# Altium footprint library Angler.PcbLib: 331 footprints (part 2 of 21)
Each footprint in its own frame and in the unit in brackets; x right, y up, seen from the top. Pads: shape width x height; smd on the part's side, far side on the other; paste and mask are expansions set on the pad; w line width, h text height; cw(c..) or ccw(c..) is an arc to the next point about the centre after c.
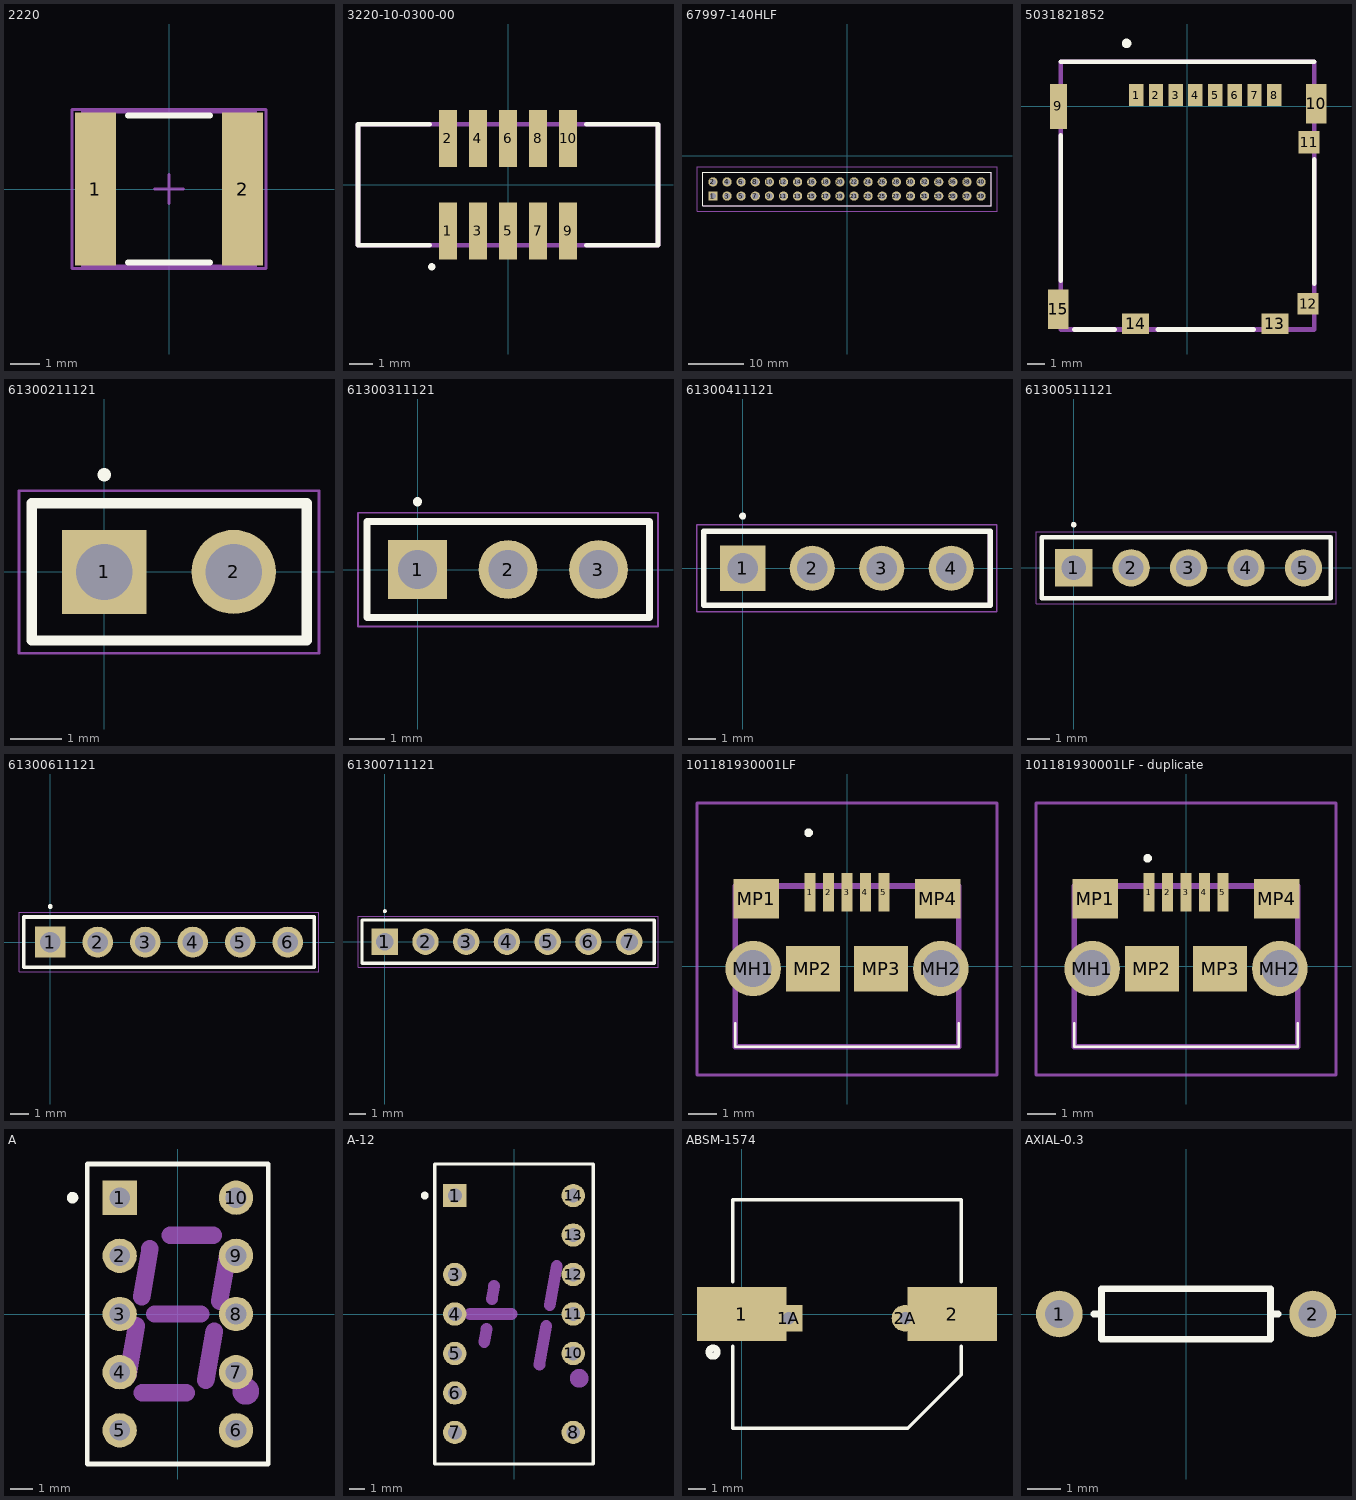
[diagram p1: the footprints below, top view; thin cyan lines are the x and y axes]

## 2220 [mm] "Chip Capacitor, Body 5.7x5.0mm, IPC High Density"
height 1.4
pads (2):
  rect 1.4x5.2 smd: 1(-2.5,0) 2(2.5,0)
Top Overlay:
  lines w0.2: -1.4,-2.5 1.4,-2.5 ; -1.4,2.5 1.4,2.5
Mechanical 13:
  lines w0.1: -2.95,-2.625 -2.95,2.625 2.95,2.625 2.95,-2.625 -2.95,-2.625
Mechanical 15:
  lines w0.1: -0.5,0 0.5,0 ; 0,-0.5 0,0.5 ; -3.3,-2.7 -3.3,2.7 3.3,2.7 3.3,-2.7 -3.3,-2.7
3D body: height 1.4, standoff 0, extent -2.95,-2.625 2.95,2.625

## 3220-10-0300-00 [mm]
pads (10):
  rect 0.76x2.4 smd: 1(-2.54,-1.95) 2(-2.54,1.95) 3(-1.27,-1.95) 4(-1.27,1.95) 5(0,-1.95) 6(0,1.95) 7(1.27,-1.95) 8(1.27,1.95) 9(2.54,-1.95) 10(2.54,1.95)
Top Overlay:
  circle w0.2: c-3.215,-3.463 r0.052
  lines w0.2: -3.3,-2.55 -6.325,-2.55 -6.325,2.55 -3.3,2.55 ; 3.3,-2.55 6.325,-2.55 6.325,2.55 3.3,2.55
Mechanical 13:
  lines w0.2: -6.325,-2.55 6.325,-2.55 6.325,2.55 -6.325,2.55 -6.325,-2.55
3D body "3220-10-0300.STEP": height 5.4, standoff -0.2, extent -6.325,-2.75 6.325,2.75

## 67997-140HLF [mm] "CONN HEADER VERT 40POS"
pads (40):
  rect 1.65x1.65 hole 1.1: 1(-24.13,-7.27)
  round 1.65 hole 1.1: 2(-24.13,-4.73) 3(-21.59,-7.27) 4(-21.59,-4.73) 5(-19.05,-7.27) 6(-19.05,-4.73) 7(-16.51,-7.27) 8(-16.51,-4.73) 9(-13.97,-7.27) 10(-13.97,-4.73) 11(-11.43,-7.27) 12(-11.43,-4.73) 13(-8.89,-7.27) 14(-8.89,-4.73) 15(-6.35,-7.27) 16(-6.35,-4.73) 17(-3.81,-7.27) 18(-3.81,-4.73) 19(-1.27,-7.27) 20(-1.27,-4.73) 21(1.27,-7.27) 22(1.27,-4.73) 23(3.81,-7.27) 24(3.81,-4.73) 25(6.35,-7.27) 26(6.35,-4.73) 27(8.89,-7.27) 28(8.89,-4.73) 29(11.43,-7.27) 30(11.43,-4.73) 31(13.97,-7.27) 32(13.97,-4.73) 33(16.51,-7.27) 34(16.51,-4.73) 35(19.05,-7.27) 36(19.05,-4.73) 37(21.59,-7.27) 38(21.59,-4.73) 39(24.13,-7.27) 40(24.13,-4.73)
Top Overlay:
  lines w0.2: -26,-9 26,-9 26,-3 -26,-3 -26,-9
Mechanical 13:
  lines w0.1: -26,-9 26,-9 26,-3 -26,-3 -26,-9
Mechanical 15:
  lines w0.05: -27,-10 27,-10 27,-2 -27,-2 -27,-10
3D body "61304021121_Download_STP_61304021121_rev1.stp": height 8.77, standoff -2.77, extent -25.4,-8.54 25.4,-3.46

## 5031821852 [mm]
pads (15):
  rect 0.8x1.24 smd: 1(-2.85,0.63) 2(-1.75,0.63) 3(-0.65,0.63) 4(0.45,0.63) 5(1.55,0.63) 6(2.65,0.63) 7(3.75,0.63) 8(4.85,0.63)
  rect 0.95x2.5 smd: 9(-7.195,0)
  rect 1.15x2.2 smd: 10(7.195,0.15) 15(-7.195,-11.33)
  rect 1.16x1.25 smd: 11(6.795,-2)
  rect 1.16x1.2 smd: 12(6.74,-11)
  rect 1.5x1.15 smd: 13(4.89,-12.125) 14(-2.89,-12.125)
Top Overlay:
  circle w0.254: c-3.388,3.517 r0.14
  lines w0.254: -7.07,-9.733 -7.07,-1.618 ; -7.07,2.5 7.07,2.5 ; -6.3,-12.45 -4.055,-12.45 ; -1.654,-12.45 3.704,-12.45 ; 7.07,-9.889 7.07,-2.952
Mechanical 13:
  lines w0.254: -7.07,-12.45 -7.07,2.5 7.07,2.5 7.07,-12.45 -7.07,-12.45
3D body "5031821852_colour.STEP": height 1.5, standoff 0, extent -7.47,-12.58 7.47,2.37

## 61300211121 [mm]
pads (2):
  rect 1.65x1.65 hole 1.1: 1(0,0)
  round 1.65 hole 1.1: 2(2.54,0)
Top Overlay:
  circle w0.254: c0,1.905 r0.002
  lines w0.2: -1.42,-1.345 3.97,-1.345 3.97,1.345 -1.42,1.345 -1.42,-1.345
Mechanical 13:
  lines w0.1: -1.42,-1.345 -1.42,1.345 3.97,1.345 3.97,-1.345 -1.42,-1.345
Mechanical 15:
  lines w0.05: -1.67,-1.595 -1.67,1.595 4.21,1.595 4.21,-1.595 -1.67,-1.595
3D body "Download_STP_61300211121 (rev1).stp": height 8.57, standoff -2.97, extent -1.27,-1.27 3.81,1.27

## 61300311121 [mm]
pads (3):
  rect 1.65x1.65 hole 1.1: 1(0,0)
  round 1.65 hole 1.1: 2(2.54,0) 3(5.08,0)
Top Overlay:
  circle w0.254: c0,1.905 r0.002
  lines w0.2: -1.42,-1.345 -1.42,1.345 6.51,1.345 6.51,-1.345 -1.42,-1.345
Mechanical 13:
  lines w0.1: -1.42,-1.345 6.51,-1.345 6.51,1.345 -1.42,1.345 -1.42,-1.345
Mechanical 15:
  lines w0.05: -1.67,-1.595 6.75,-1.595 6.75,1.595 -1.67,1.595 -1.67,-1.595
3D body "Download_STP_61300311121 (rev1).stp": height 8.57, standoff -2.97, extent -1.27,-1.27 6.35,1.27

## 61300411121 [mm]
pads (4):
  rect 1.65x1.65 hole 1.1: 1(0,0)
  round 1.65 hole 1.1: 2(2.54,0) 3(5.08,0) 4(7.62,0)
Top Overlay:
  circle w0.254: c0,1.905 r0.002
  lines w0.2: -1.42,-1.345 9.05,-1.345 9.05,1.345 -1.42,1.345 -1.42,-1.345
Mechanical 13:
  lines w0.1: -1.42,-1.345 -1.42,1.345 9,1.345 9,-1.345 -1.42,-1.345
Mechanical 15:
  lines w0.05: -1.67,-1.595 -1.67,1.595 9.29,1.595 9.29,-1.595 -1.67,-1.595
3D body "Downlaod_STP_61300411121 (rev1).stp": height 8.57, standoff -2.97, extent -1.28,-1.27 8.88,1.27

## 61300511121 [mm]
pads (5):
  rect 1.65x1.65 hole 1.1: 1(0,0)
  round 1.65 hole 1.1: 2(2.54,0) 3(5.08,0) 4(7.62,0) 5(10.16,0)
Top Overlay:
  circle w0.2: c0,1.905 r0.026
  lines w0.2: -1.42,-1.345 11.36,-1.345 11.36,1.345 -1.42,1.345 -1.42,-1.345
Mechanical 13:
  lines w0.1: -1.42,-1.345 11.36,-1.345 11.36,1.345 -1.42,1.345 -1.42,-1.345
Mechanical 15:
  lines w0.05: -1.67,-1.595 -1.67,1.595 11.6,1.595 11.6,-1.595 -1.67,-1.595
3D body "Download_STP_61300511121 (rev1).stp": height 8.57, standoff -2.97, extent -1.27,-1.27 11.43,1.27

## 61300611121 [mm]
pads (6):
  rect 1.65x1.65 hole 1.1: 1(0,0)
  round 1.65 hole 1.1: 2(2.54,0) 3(5.08,0) 4(7.62,0) 5(10.16,0) 6(12.7,0)
Top Overlay:
  circle w0.2: c0,1.905 r0.026
  lines w0.2: -1.42,-1.345 14.12,-1.345 14.12,1.345 -1.42,1.345 -1.42,-1.345
Mechanical 13:
  lines w0.1: -1.42,-1.345 14.12,-1.345 14.12,1.345 -1.42,1.345 -1.42,-1.345
Mechanical 15:
  lines w0.05: -1.67,-1.595 14.37,-1.595 14.37,1.595 -1.67,1.595 -1.67,-1.595
3D body "61300611121.stp": height 8.69, standoff -3.2, extent -1.27,-1.27 13.97,1.27

## 61300711121 [mm]
pads (7):
  rect 1.65x1.65 hole 1.1: 1(0,0)
  round 1.65 hole 1.1: 2(2.54,0) 3(5.08,0) 4(7.62,0) 5(10.16,0) 6(12.7,0) 7(15.24,0)
Top Overlay:
  circle w0.2: c0,1.905 r0.026
  lines w0.2: -1.42,-1.345 -1.42,1.345 16.8,1.345 16.8,-1.345 -1.42,-1.345
Mechanical 13:
  lines w0.1: -1.42,-1.345 -1.42,1.345 16.8,1.345 16.8,-1.345 -1.42,-1.345
Mechanical 15:
  lines w0.05: -1.67,-1.595 -1.67,1.595 17.04,1.595 17.04,-1.595 -1.67,-1.595
3D body "61300711121_Download_STP_61300711121_rev1.stp": height 8.67, standoff -2.87, extent -1.27,-1.26 16.51,1.28

## 101181930001LF [mm]
pads (11):
  rect 0.4x1.35 smd: 1(-1.3,2.6) 2(-0.65,2.6) 3(0,2.6) 4(0.65,2.6) 5(1.3,2.6)
  round 1.95 hole 1.3: MH1(-3.3,-0.075) MH2(3.3,-0.075)
  rect 1.6x1.4 smd: MP1(-3.2,2.375) MP4(3.2,2.375)
  rect 1.9x1.6 smd: MP2(-1.2,-0.075) MP3(1.2,-0.075)
Top Overlay:
  lines w0.1: -3.93,-2.825 3.93,-2.825 ; -3.93,-2.825 3.93,-2.825 ; -3.93,-2.825 -3.93,-2 -3.93,-2.825 ; 3.93,-2.825 3.93,-2 3.93,-2.825
  lines w0.2: -1.4,4.7 ccw(c-1.35,4.7) -1.3,4.7 ; -1.4,4.7 cw(c-1.35,4.7) -1.3,4.7 ; -1.4,4.7 ccw(c-1.35,4.7) -1.3,4.7
Mechanical 13:
  lines w0.2: -3.93,-2.825 -3.93,2.825 3.93,2.825 3.93,-2.825 -3.93,-2.825
Mechanical 15:
  lines w0.1: -5.275,-3.825 -5.275,5.75 5.275,5.75 5.275,-3.825 -5.275,-3.825
3D body "10118193-0001lfc.stp": height 2.78, standoff -0.82, extent -3.928,-2.732 3.929,2.929

## 101181930001LF - duplicate [mm]
pads (11):
  rect 0.4x1.35 smd: 1(-1.3,2.6) 2(-0.65,2.6) 3(0,2.6) 4(0.65,2.6) 5(1.3,2.6)
  round 1.95 hole 1.3: MH1(-3.3,-0.075) MH2(3.3,-0.075)
  rect 1.6x1.4 smd: MP1(-3.2,2.375) MP4(3.2,2.375)
  rect 1.9x1.6 smd: MP2(-1.2,-0.075) MP3(1.2,-0.075)
Top Overlay:
  lines w0.1: -3.93,-2.825 3.93,-2.825 ; -3.93,-2.825 3.93,-2.825 ; -3.93,-2.825 -3.93,-2 -3.93,-2.825 ; 3.93,-2.825 3.93,-2 3.93,-2.825
  lines w0.2: -1.4,3.8 ccw(c-1.35,3.8) -1.3,3.8 ; -1.4,3.8 cw(c-1.35,3.8) -1.3,3.8 ; -1.4,3.8 ccw(c-1.35,3.8) -1.3,3.8
Mechanical 13:
  lines w0.2: -3.93,-2.825 -3.93,2.825 3.93,2.825 3.93,-2.825 -3.93,-2.825
Mechanical 15:
  lines w0.1: -5.275,-3.825 -5.275,5.75 5.275,5.75 5.275,-3.825 -5.275,-3.825
3D body "10118193-0001lfc.stp": height 2.78, standoff -0.82, extent -3.928,-2.761 3.928,2.9

## A [mm] "LED, 7-Segment Display, 7.62 mm, RHD; 10 Leads; Row Space 5.08 mm; Pitch 2.54 mm"
height 6.34
pads (10):
  rect 1.5x1.5 hole 0.9: 1(-2.54,5.08)
  round 1.5 hole 0.9: 2(-2.54,2.54) 3(-2.54,0) 4(-2.54,-2.54) 5(-2.54,-5.08) 6(2.54,-5.08) 7(2.54,-2.54) 8(2.54,0) 9(2.54,2.54) 10(2.54,5.08)
Top Overlay:
  circle w0.25: c-4.6,5.08 r0.125
  lines w0.2: -3.95,-6.55 -3.95,6.55 3.95,6.55 3.95,-6.55 -3.95,-6.55
Mechanical 1:
  circle w0.86: c2.97,-3.38 r0.15
  lines w0.762: -2.19,-2.69 -1.81,-0.52 ; -1.58,0.76 -1.22,2.84 ; -1.56,-3.43 0.36,-3.43 ; -1.004,0 1.004,0 ; -0.34,3.43 1.55,3.43 ; 1.22,-2.89 1.59,-0.76 ; 1.82,0.56 2.2,2.69
Mechanical 13:
  lines w0.1: -3.95,-6.55 -3.95,6.55 3.95,6.55 3.95,-6.55 -3.95,-6.55
3D body: height 6.34, standoff 0, extent -3.95,-6.55 3.95,6.55

## A-12 [mm] "LED, Universal ±1 Overflow, 7.62 mm, RHD; 14 Leads (2 Absent); Row Space 7.62 mm; Pitch 2.54 mm"
height 6.35
pads (12):
  rect 1.5x1.5 hole 0.9: 1(-3.81,7.62)
  round 1.5 hole 0.9: 3(-3.81,2.54) 4(-3.81,0) 5(-3.81,-2.54) 6(-3.81,-5.08) 7(-3.81,-7.62) 8(3.81,-7.62) 10(3.81,-2.54) 11(3.81,0) 12(3.81,2.54) 13(3.81,5.08) 14(3.81,7.62)
Top Overlay:
  circle w0.25: c-5.75,7.62 r0.125
  lines w0.2: -5.1,-9.65 -5.1,9.65 5.1,9.65 5.1,-9.65 -5.1,-9.65
Mechanical 1:
  circle w0.86: c4.19,-4.139 r0.17
  lines w0.762: -2.83,0 -0.17,0 ; -1.911,-1.799 -1.764,-0.962 ; -1.427,0.961 -1.28,1.8 ; 1.63,-3.262 2.071,-0.764 ; 2.303,0.565 2.747,3.084
Mechanical 13:
  lines w0.1: -5.1,-9.65 5.1,-9.65 5.1,9.65 -5.1,9.65 -5.1,-9.65
3D body: height 6.35, standoff 0, extent -5.1,-9.65 5.1,9.65

## ABSM-1574 [mm] "Magnetic Transducer Buzzer"
pads (4):
  rect 5x3 smd: 1(0,0) 2(11.8,0)
  rect 1.5x1.5 hole 0.7: 1A(2.65,-0.24)
  round 1.5 hole 0.7: 2A(9.15,-0.24)
Top Overlay:
  circle w0.4: c-1.6,-2.134 r0.227
  lines w0.2: -0.5,-1.8 -0.5,-6.4 9.3,-6.4 12.3,-3.4 12.3,-1.8 ; -0.5,1.8 -0.5,6.4 12.3,6.4 12.3,1.8

## AXIAL-0.3 [mm] "Axial Device, Thru-Hole; 2 Leads; 0.3 in Pin Spacing"
height 1.524
pads (2):
  round 1.4 hole 0.85: 1(-3.81,0) 2(3.81,0)
Top Overlay:
  lines w0.2: -2.769,0 -2.54,0 ; 2.769,0 2.54,0 ; 2.54,0 2.54,-0.762 -2.54,-0.762 -2.54,0.762 2.54,0.762 2.54,0